# Altium footprint library Dahlia Carrier Board.PcbLib: 99 footprints (part 4 of 7)
Each footprint in its own frame and in the unit in brackets; x right, y up, seen from the top. Pads: shape width x height; smd on the part's side, far side on the other; paste and mask are expansions set on the pad; w line width, h text height; cw(c..) or ccw(c..) is an arc to the next point about the centre after c.
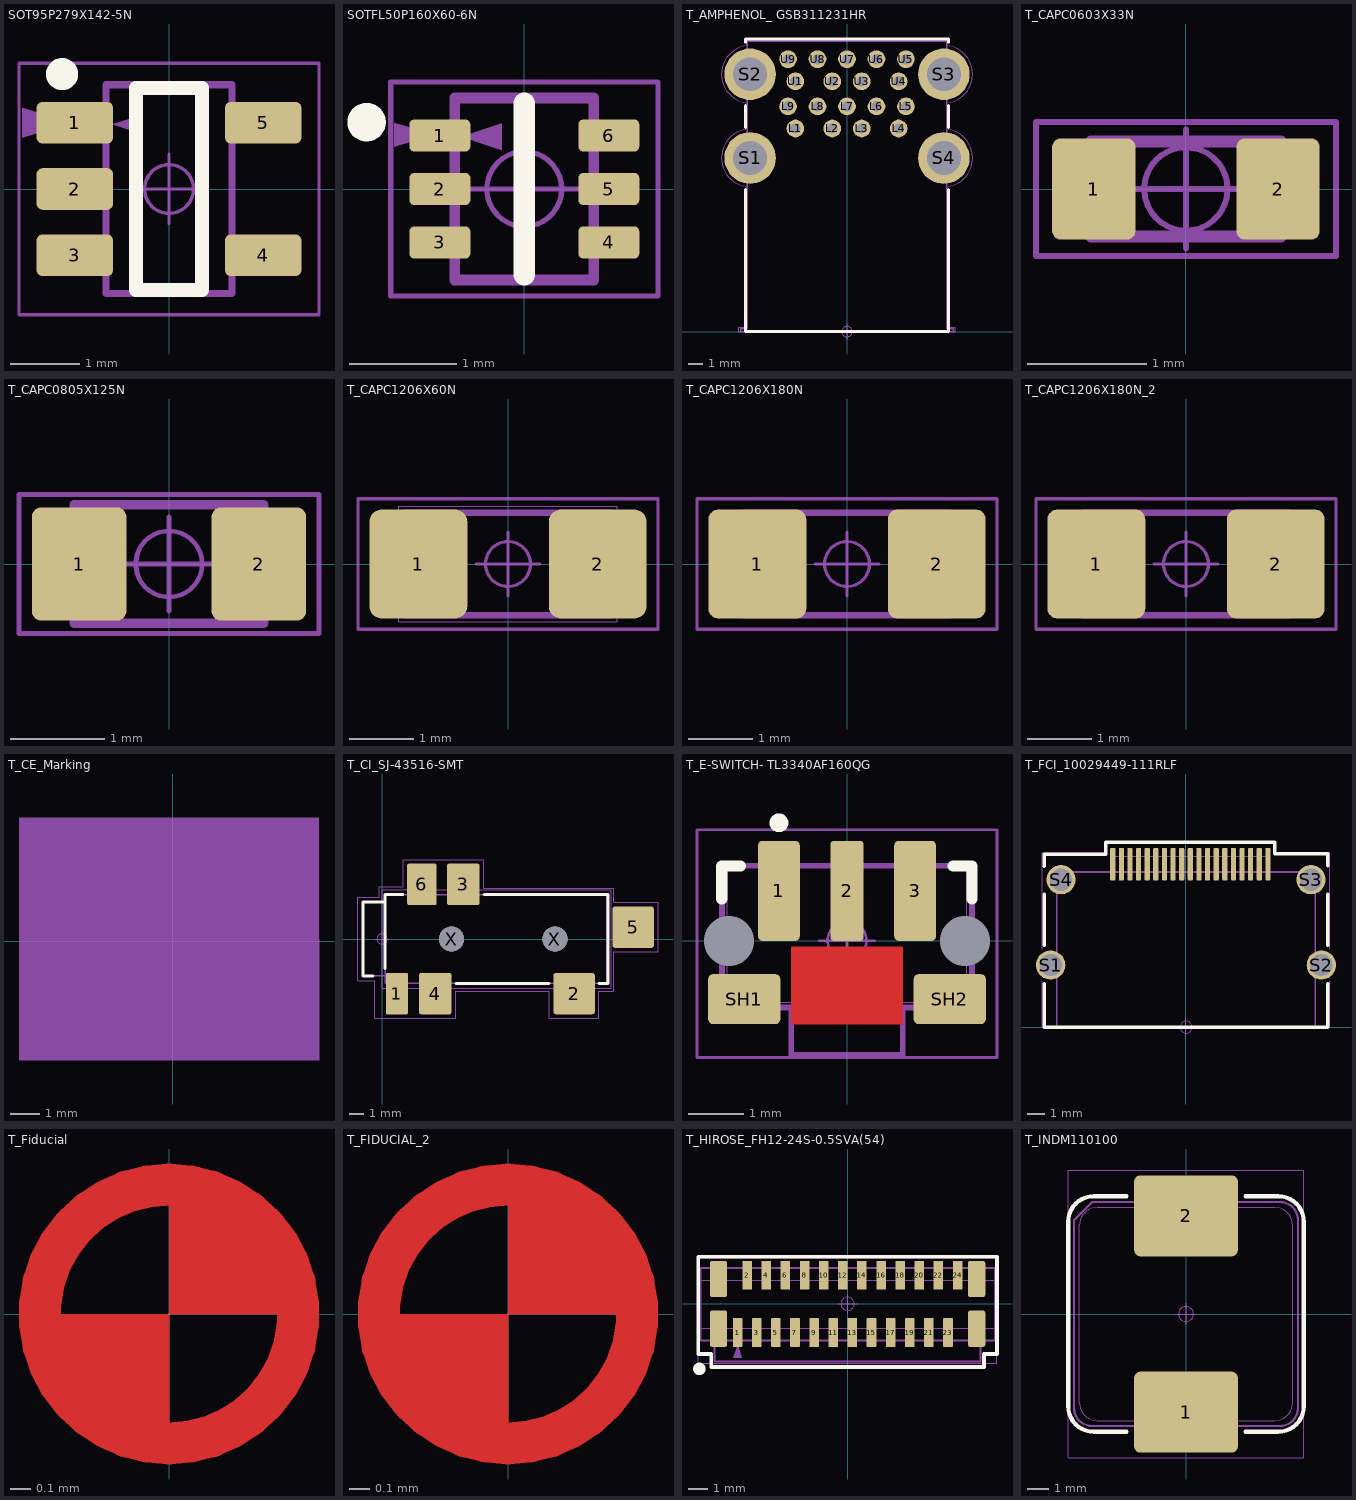
[diagram p3: the footprints below, top view; thin cyan lines are the x and y axes]

## SOT95P279X142-5N [mm]
height 13.83
pads (5):
  rrect30% 1.1x0.6 smd: 1(-1.35,0.95) 2(-1.35,0) 3(-1.35,-0.95) 4(1.35,-0.95) 5(1.35,0.95)
Top Overlay:
  circle w0.3: c-1.533,1.646 r0.08
  lines w0.2: -0.475,-1.45 -0.475,1.45 0.475,1.45 0.475,-1.45 -0.475,-1.45
Top Component Outline:
  region: -2.1,0.737 -1.39,0.95 -2.1,1.163
  lines w0.05: -2.15,-1.8 -2.15,1.8 2.15,1.8 2.15,-1.8 -2.15,-1.8
Top 3D Body:
  lines w0.001: -0.9,-1.45 -0.9,1.45 0.9,1.45 0.9,-1.45 -0.9,-1.45
Top Dimensions:
  region: -0.81,0.925 -0.429,1.052 -0.429,0.798
  lines w0.1: -0.9,-1.5 -0.9,1.5 0.9,1.5 0.9,-1.5 -0.9,-1.5
Top Component Center:
  circle w0.05: c0,0 r0.35
  lines w0.05: -0.5,0 0.5,0 ; 0,-0.5 0,0.5
Top Assembly:
  text ".Designator" at -1.7,2.25 h0.75
3D body "User Library-SOT23-5-2.step": height 1.45, standoff 0, extent -1.4,-1.45 1.4,1.45

## SOTFL50P160X60-6N [mm]
height 5.5
pads (6):
  rrect30% 0.57x0.3 smd: 1(-0.79,0.5) 2(-0.79,0) 3(-0.79,-0.5) 4(0.79,-0.5) 5(0.79,0) 6(0.79,0.5)
Top Overlay:
  circle w0.2: c-1.475,0.625 r0.08
  lines w0.2: 0,-0.8 0,0.8
Top Component Outline:
  region: -1.214,0.393 -0.836,0.507 -1.214,0.62
  lines w0.05: -1.25,-1 1.25,-1 1.25,1 -1.25,1 -1.25,-1
Top 3D Body:
  lines w0.001: -0.65,-0.85 0.65,-0.85 0.65,0.85 -0.65,0.85 -0.65,-0.85
Top Dimensions:
  region: -0.59,0.489 -0.209,0.616 -0.209,0.362
  lines w0.1: -0.65,-0.85 0.65,-0.85 0.65,0.85 -0.65,0.85 -0.65,-0.85
Top Component Center:
  circle w0.05: c0,0 r0.35
  lines w0.05: -0.5,0 0.5,0 ; 0,-0.5 0,0.5
Top Assembly:
  text ".Designator" at -1.4,1.35 h0.75
3D body "User Library-SOT-563.STEP": height 0.58, standoff 0, extent -0.813,-0.8 0.813,0.8

## T_AMPHENOL_ GSB311231HR [mm]
height 13.83
pads (22):
  round 1.2 hole 0.7: L1(-3.5,13.78) L2(-1,13.78) L3(1,13.78) L4(3.5,13.78) L5(4,15.28) L6(2,15.28) L7(0,15.28) L8(-2,15.28) L9(-4,15.28) U1(-3.5,16.98) U2(-1,16.98) U3(1,16.98) U4(3.5,16.98) U5(4,18.48) U6(2,18.48) U7(0,18.48) U8(-2,18.48) U9(-4,18.48)
  round 3.5 hole 2.3: S1(-6.57,11.78) S2(-6.57,17.46) S3(6.57,17.46) S4(6.57,11.78)
Top Overlay:
  lines w0.2: -6.9,9.65 -6.9,0 6.9,0 6.9,9.65 ; -6.9,13.85 -6.9,15.35 ; -6.9,19.63 -6.9,19.85 6.9,19.85 6.9,19.63 ; 6.9,13.85 6.9,15.35
Top Component Outline:
  lines w0.05: -6.809,9.837 -6.809,0.3 -7.349,0.3 -7.349,0 7.349,0 7.349,0.3 6.81,0.3 6.809,9.838 ; -6.809,13.725 -6.809,15.515 ; -6.809,9.837 cw(c-6.565,11.779) -6.809,13.722 ; -6.809,15.517 cw(c-6.565,17.459) -6.809,19.402 -6.809,19.76 6.809,19.76 6.809,19.403 ; 6.809,9.838 ccw(c6.565,11.781) 6.809,13.723 ; 6.809,15.518 ccw(c6.565,17.461) 6.809,19.403 ; 6.809,13.725 6.809,15.515
Top 3D Body:
  lines w0.01: -6.753,19.7 6.747,19.7 ; -6.75,19.7 -6.75,0.2 -7.2,0.2 -7.2,0 7.2,0 7.2,0.2 ; 6.75,19.7 6.75,0.2 7.2,0.2
Top Dimensions:
  lines w0.1: -7.2,0 -7.2,0.2 -6.75,0.2 -6.75,19.7 6.75,19.7 6.75,0.2 7.2,0.2 7.2,0 -7.2,0
Top Component Center:
  circle w0.05: c0,0 r0.35
  lines w0.05: -0.5,0 0.5,0 ; 0,-0.5 0,0.5
Top Assembly:
  text ".Designator" at 0.475,8.361 h0.75
3D body "GSB311231HR.STEP": height 16.13, standoff -3.49, extent -7.795,0 7.795,19.7

## T_CAPC0603X33N [mm]
pads (2):
  rrect20% 0.7x0.85 smd: 1(-0.775,0) 2(0.775,0)
Top Component Outline:
  lines w0.05: -1.261,-0.563 1.262,-0.563 1.262,0.563 -1.261,0.563 -1.261,-0.563
Top 3D Body:
  lines w0.001: -0.8,-0.4 0.8,-0.4 0.8,0.4 -0.8,0.4 -0.8,-0.4
Top Dimensions:
  lines w0.1: -0.8,-0.4 0.8,-0.4 0.8,0.4 -0.8,0.4 -0.8,-0.4
Top Component Center:
  circle w0.05: c0,0 r0.35
  lines w0.05: -0.5,0 0.5,0 ; 0,-0.5 0,0.5
Top Assembly:
  text ".Designator" at 0.575,0.25 h0.75
3D body "User Library-CAPC1608X09.step": height 0.9, standoff 0, extent -0.8,-0.4 0.8,0.4

## T_CAPC0805X125N [mm]
height 5.5
pads (2):
  rrect20% 1x1.2 smd: 1(-0.95,0) 2(0.95,0)
Top Component Outline:
  lines w0.05: -1.586,-0.736 -1.586,0.736 1.586,0.736 1.586,-0.736 -1.586,-0.736
Top 3D Body:
  lines w0.001: -1,-0.625 1,-0.625 1,0.625 -1,0.625 -1,-0.625
Top Dimensions:
  lines w0.1: -1,-0.625 -1,0.625 1,0.625 1,-0.625 -1,-0.625
Top Component Center:
  circle w0.05: c0,0 r0.35
  lines w0.05: -0.5,0 0.5,0 ; 0,-0.5 0,0.5
Top Assembly:
  text ".Designator" at -1.225,0.95 h0.75
3D body "User Library-CAPC2013X10.STEP": height 1, standoff 0, extent -1,-0.625 1,0.625

## T_CAPC1206X60N [mm]
pads (2):
  rrect25% 1.524x1.7 smd: 1(-1.397,0) 2(1.397,0)
Top Component Outline:
  lines w0.05: -2.337,-1.016 -2.337,1.016 2.336,1.016 2.336,-1.016 -2.337,-1.016
Top 3D Body:
  lines w0.001: -1.7,-0.9 1.7,-0.9 1.7,0.9 -1.7,0.9 -1.7,-0.9
Top Dimensions:
  lines w0.1: -1.6,-0.8 -1.6,0.8 1.6,0.8 1.6,-0.8 -1.6,-0.8
Top Component Center:
  circle w0.05: c0,0 r0.35
  lines w0.05: -0.5,0 0.5,0 ; 0,-0.5 0,0.5
Top Assembly:
  text ".Designator" at -0.6,-0.275 h0.75
3D body "c1206c225k5ractu.stp": height 1.8, standoff 0, extent -1.7,-0.9 1.7,0.9

## T_CAPC1206X180N [mm]
height 13.83
pads (2):
  rrect20% 1.524x1.7 smd: 1(-1.397,0) 2(1.397,0)
Top Component Outline:
  lines w0.05: -2.337,-1.016 -2.337,1.016 2.336,1.016 2.336,-1.016 -2.337,-1.016
Top 3D Body:
  lines w0.01: -1.6,-0.8 1.6,-0.8 1.6,0.8 -1.6,0.8 -1.6,-0.8
Top Dimensions:
  lines w0.1: -1.6,-0.8 -1.6,0.8 1.6,0.8 1.6,-0.8 -1.6,-0.8
Top Component Center:
  circle w0.05: c0,0 r0.35
  lines w0.05: -0.5,0 0.5,0 ; 0,-0.5 0,0.5
Top Assembly:
  text ".Designator" at -1.475,1.325 h0.75
3D body "capacitor 1206.step": height 1, standoff 0, extent -1.6,-0.8 1.6,0.8

## T_CAPC1206X180N_2 [mm]
pads (2):
  rrect20% 1.524x1.7 smd: 1(-1.397,0) 2(1.397,0)
Top Component Outline:
  lines w0.05: -2.337,-1.016 -2.337,1.016 2.336,1.016 2.336,-1.016 -2.337,-1.016
Top 3D Body:
  lines w0.01: -1.6,-0.8 1.6,-0.8 1.6,0.8 -1.6,0.8 -1.6,-0.8
Top Dimensions:
  lines w0.1: -1.6,-0.8 -1.6,0.8 1.6,0.8 1.6,-0.8 -1.6,-0.8
Top Component Center:
  circle w0.05: c0,0 r0.35
  lines w0.05: -0.5,0 0.5,0 ; 0,-0.5 0,0.5
Top Assembly:
  text ".Designator" at -1.475,1.325 h0.75
3D body "capacitor 1206.step": height 1, standoff 0, extent -1.6,-0.8 1.6,0.8

## T_CE_Marking [mm] "Silkscreen CE Marking"
height 5.49
Bottom Overlay:
  text "W" at 22.75,6.05 h10
  text "R" at 31.05,11.025 h15
  text "ELECTROSTATIC" at 33.9,4.7 h1.5
  text "ATTENTION" at 32.2,6 h1.5
  text "SENSITIVE DEVICE" at 34.5,3.4 h1.5
  text "C" at 23.85,16.425 h10
  text "e" at 32.8,5.425 h12
Top 3D Body:
  region: -5.283,4.242 5.029,4.242 5.029,-4.089 -5.283,-4.089

## T_CI_SJ-43516-SMT [mm] "STEREO_3.5mm AUDIO JACK  CUI"
height 5
pads (8):
  rrect12% 1.5x2.8 smd: 1(1,-3.7)
  rrect12% 2.8x2.8 smd: 2(13,-3.7) 5(17,0.8)
  rrect12% 2.2x2.8 smd: 3(5.5,3.7) 4(3.6,-3.7)
  rrect12% 2x2.8 smd: 6(2.7,3.7)
  round 1.7 hole 1.7 unplated: X(4.7,0) X(11.7,0)
Top Overlay:
  lines w0.2: -0.6,-2.5 -1.3,-2.5 -1.3,2.5 0.2,2.5 ; 0.2,-2 0.2,3 1.4,3 ; 5,-3 11.3,-3 ; 6.9,3 15.3,3 15.3,-3 14.7,-3
Top Component Outline:
  lines w0.05: -1.63,-2.83 -1.63,2.83 -0.19,2.83 -0.19,3.53 1.42,3.53 1.42,5.38 6.88,5.38 6.88,3.45 15.68,3.45 15.68,2.48 18.68,2.48 18.68,-0.87 15.68,-0.87 15.68,-3.53 14.68,-3.53 14.68,-5.38 11.32,-5.38 11.32,-3.53 4.98,-3.53 4.98,-5.38 -0.48,-5.38 -0.48,-2.83 -1.63,-2.83
Top 3D Body:
  lines w0.001: 0,-3.35 0,3.35 15.5,3.35 15.5,-3.35 0,-3.35
Top Dimensions:
  lines w0.1: 0.2,-2.5 -1.3,-2.5 -1.3,2.5 0.2,2.5 ; 0.2,-3 15.2,-3 15.2,3 0.2,3 0.2,-3
Top Component Center:
  circle w0.05: c0,0 r0.35
  lines w0.05: -0.5,0 0.5,0 ; 0,-0.5 0,0.5
Top Assembly:
  text ".Designator" at 7,-0.175 h0.75
3D body "SJ-43516-SMT.stp": height 5.12, standoff -0.68, extent -1.5,-4.5 17.7,4.5

## T_E-SWITCH- TL3340AF160QG [mm] "SWITCH TACT SUB MINI 160GF SMD"
height 3.3
pads (7):
  rrect20% 0.75x1.8 smd: 1(-1.225,0.9) 3(1.225,0.9)
  rrect20% 0.6x1.8 smd: 2(0,0.9)
  rrect20% 1.3x0.9 smd: SH1(-1.85,-1.05) SH2(1.85,-1.05)
  round 0.5 hole 0.9 unplated: ""(-2.125,0) ""(2.125,0)
Top Layer:
  pour cut-out: -1,-0.103 -1,-1.5 1,-1.5 1,-0.103
Top Overlay:
  circle w0.254: c-1.225,2.125 r0.041
  lines w0.2: -2.255,0.75 -2.255,1.35 -1.915,1.35 ; 1.91,1.35 2.25,1.35 2.25,0.75
Top Component Outline:
  lines w0.05: -2.7,-2.1 2.7,-2.1 2.7,2 -2.7,2 -2.7,-2.1
Top 3D Body:
  lines w0.001: -2.25,-1.105 2.25,-1.105 ; -2.155,-1.2 -2.155,1.35 ; -1,-1.2 -1,-2.05 1,-2.05 1,-1.2 ; 2,-1.2 2.25,-1.2 ; 2.155,-0.42 2.25,-0.42 ; 2.155,0.42 2.25,0.42 ; 2.155,1.35 2.155,-1.2 2.25,-1.2 ; -2.25,-1.2 -2,-1.2 -2.25,-1.2 ; -2.25,-1.2 2.25,-1.2 ; -2.25,-1.2 -2.25,1.35 2.25,1.35 2.25,-1.2
Top Dimensions:
  lines w0.1: -1,-1.2 -1,-2.05 1,-2.05 1,-1.2 ; -2.25,-1.2 2.25,-1.2 2.25,1.35 -2.25,1.35 -2.25,-1.2
Top Component Center:
  circle w0.05: c0,0 r0.35
  lines w0.05: -0.5,0 0.5,0 ; 0,-0.5 0,0.5
Top Assembly:
  text ".Designator" at 0.7,0.225 h0.75
3D body "TL3340AF160QG.stp": height 3.27, standoff -0.48, extent -2.25,-2.1 2.25,1.565

## T_FCI_10029449-111RLF [mm]
pads (23):
  rrect50% 0.3x1.9 smd: 1(4.75,9.45) 2(4.25,9.45) 3(3.75,9.45) 4(3.25,9.45) 5(2.75,9.45) 6(2.25,9.45) 7(1.75,9.45) 8(1.25,9.45) 9(0.75,9.45) 10(0.25,9.45) 11(-0.25,9.45) 12(-0.75,9.45) 13(-1.25,9.45) 14(-1.75,9.45) 15(-2.25,9.45) 16(-2.75,9.45) 17(-3.25,9.45) 18(-3.75,9.45) 19(-4.25,9.45)
  round 1.7 hole 1.3: S1(-7.85,3.6) S2(7.85,3.6) S3(7.25,8.55) S4(-7.25,8.55)
Top Overlay:
  lines w0.2: -8.225,2.525 -8.225,0 8.225,0 8.225,2.525 ; -8.225,4.745 -8.225,7.7 ; -8.225,9.315 -8.225,10.025 -4.65,10.025 -4.65,10.72 5.15,10.72 5.15,10.055 8.225,10.055 8.225,9.345 ; 8.225,4.745 8.225,7.7
Top Paste:
  circle w1: c-7.25,8.55 r0.351
  circle w1: c-7.85,3.6 r0.351
  circle w1: c7.85,3.6 r0.351
  circle w1: c7.25,8.55 r0.351
Top Component Outline:
  lines w0.05: -8.325,2.66 -8.325,0 8.325,0 8.325,2.66 ; -8.325,4.525 -8.325,10.125 -4.65,10.125 -4.65,10.695 5.15,10.695 5.15,10.15 8.325,10.15 8.325,4.525
Top 3D Body:
  lines w0.01: -7.5,0 -7.5,9 ; -7.5,0 7.5,0 ; -7.5,0 -7.5,9 ; -7.5,0 7.5,0 ; -7.5,9 7.5,9 ; -7.5,9 7.5,9 ; -4.35,9.9 4.85,9.9 ; -4.35,9.9 -4.35,9 -4.35,9.9 ; -4.35,9.9 4.85,9.9 ; 4.85,9.9 4.85,9 4.85,9.9 ; 7.5,0 7.5,9 ; 7.5,0 7.5,9
Top Dimensions:
  lines w0.1: -7.5,0 -7.5,9 7.5,9 7.5,0 -7.5,0
Top Component Center:
  circle w0.05: c0,0 r0.35
  lines w0.05: -0.5,0 0.5,0 ; 0,-0.5 0,0.5
Top Assembly:
  text ".Designator" at -1.875,11.15 h0.75
3D body "10029449-111RLF.STEP": height 6.17, standoff -1.83, extent -8.1,0 8.1,9.85

## T_Fiducial [mm]
height 5.49
pads (1):
  round 0.001 smd: ""(0,0)
Top Layer:
  region: 0,0 0,-0.6 -0.119,-0.6 -0.34,-0.509 -0.509,-0.34 -0.6,-0.119 -0.6,0
  region: 0,0 0,0.6 0.119,0.6 0.34,0.509 0.509,0.34 0.6,0.119 0.6,0
  lines w0.203: 0,-0.625 ccw(c0,0) 0,0.625 ccw(c0,0) 0,-0.625
Top Solder:
  circle w0.203: c0,0 r0.625
  region: -0.725,0 -0.725,0.071 -0.697,0.211 -0.642,0.343 -0.563,0.462 -0.462,0.563 -0.343,0.642 -0.211,0.697 -0.071,0.725 0,0.725 0.071,0.725 0.211,0.697 0.343,0.642 0.462,0.563 0.563,0.462 0.642,0.343 0.697,0.211 0.725,0.071 0.725,0 0.725,-0.071 0.697,-0.211 0.642,-0.343 0.563,-0.462 0.462,-0.563 0.343,-0.642 0.211,-0.697 0.071,-0.725 0,-0.725 -0.071,-0.725 -0.211,-0.697 -0.343,-0.642 -0.462,-0.563 -0.563,-0.462 -0.642,-0.343 -0.697,-0.211 -0.725,-0.071

## T_FIDUCIAL_2 [mm]
pads (1):
  round 0.001 smd: ""(0,0)
Top Layer:
  region: 0,0 0,0.6 0.119,0.6 0.34,0.509 0.509,0.34 0.6,0.119 0.6,0
  region: 0,0 0,-0.6 -0.119,-0.6 -0.34,-0.509 -0.509,-0.34 -0.6,-0.119 -0.6,0
  lines w0.203: 0,-0.625 cw(c0,0) 0,0.625 cw(c0,0) 0,-0.625
Top Solder:
  circle w0.203: c0,0 r0.625
  region: -0.725,0 -0.725,0.071 -0.697,0.211 -0.642,0.343 -0.563,0.462 -0.462,0.563 -0.343,0.642 -0.211,0.697 -0.071,0.725 0,0.725 0.071,0.725 0.211,0.697 0.343,0.642 0.462,0.563 0.563,0.462 0.642,0.343 0.697,0.211 0.725,0.071 0.725,0 0.725,-0.071 0.697,-0.211 0.642,-0.343 0.563,-0.462 0.462,-0.563 0.343,-0.642 0.211,-0.697 0.071,-0.725 0,-0.725 -0.071,-0.725 -0.211,-0.697 -0.343,-0.642 -0.462,-0.563 -0.563,-0.462 -0.642,-0.343 -0.697,-0.211 -0.725,-0.071

## T_HIROSE_FH12-24S-0.5SVA(54) [mm] "FFC Connector 0.5mm pitch Vertical"
height 5.5
pads (28):
  rrect12% 0.5x1.5 smd: 1(-5.75,-1.5) 2(-5.25,1.5) 3(-4.75,-1.5) 4(-4.25,1.5) 5(-3.75,-1.5) 6(-3.25,1.5) 7(-2.75,-1.5) 8(-2.25,1.5) 9(-1.75,-1.5) 10(-1.25,1.5) 11(-0.75,-1.5) 12(-0.25,1.5) 13(0.25,-1.5) 14(0.75,1.5) 15(1.25,-1.5) 16(1.75,1.5) 17(2.25,-1.5) 18(2.75,1.5) 19(3.25,-1.5) 20(3.75,1.5) 21(4.25,-1.5) 22(4.75,1.5) 23(5.25,-1.5) 24(5.75,1.5)
  rrect25% 0.9x1.9 smd: ""(-6.75,-1.3) ""(-6.75,1.3) ""(6.75,-1.3) ""(6.75,1.3)
Top Overlay:
  circle w0.4: c-7.75,-3.4 r0.125
  lines w0.2: -7.814,-2.625 -7.814,2.464 7.814,2.464 7.814,-2.625 7.132,-2.625 7.132,-3.307 -7.132,-3.307 -7.132,-2.625 -7.814,-2.625
Top Component Outline:
  region: -5.537,-2.825 -5.75,-2.115 -5.963,-2.825
  lines w0.05: -7.8,-3.116 7.8,-3.116 7.8,2.416 -7.8,2.416 -7.8,-3.116
Top 3D Body:
  lines w0.001: -6.95,-1.925 -6.95,-3.025 6.95,-3.025 6.95,-1.925
  lines w0.01: -7.7,-1.275 7.7,-1.275 ; -7.7,1.225 7.7,1.225 ; -7.7,-1.925 7.7,-1.925 7.7,1.875 -7.7,1.875 -7.7,-1.925
Top Dimensions:
  region: -5.746,-2.155 -5.523,-2.826 -5.97,-2.826
  lines w0.1: -6.95,-1.925 -6.95,-3.025 6.95,-3.025 6.95,-1.925 ; -7.7,-1.925 7.7,-1.925 7.7,1.875 -7.7,1.875 -7.7,-1.925
Top Component Center:
  circle w0.05: c0,0 r0.35
  lines w0.05: -0.5,0 0.5,0 ; 0,-0.5 0,0.5
Top Assembly:
  text ".Designator" at -0.625,-0.2 h0.75
3D body "FH12-24S-0.5SV.stp": height 5.52, standoff 0.02, extent -7.7,-1.925 7.7,1.875

## T_INDM110100 [mm]
height 13.83
pads (2):
  rrect15% 4.86x3.8 smd: 1(0,-4.6) 2(0,4.6)
Top Overlay:
  lines w0.2: -2.794,-5.523 -4.32,-5.523 cw(c-4.32,-4.32) -5.523,-4.32 -5.523,4.32 cw(c-4.32,4.32) -4.32,5.523 -2.794,5.523 ; 2.794,-5.523 4.32,-5.523 ccw(c4.32,-4.32) 5.523,-4.32 5.523,4.343 ; 2.794,5.523 4.32,5.523 cw(c4.32,4.32) 5.523,4.32
Top Component Outline:
  lines w0.05: -5.52,-6.731 5.52,-6.731 5.52,6.731 -5.52,6.731 -5.52,-6.731
Top 3D Body:
  lines w0.001: -5,-4.15 ccw(c-4.15,-4.15) -4.15,-5 4.15,-5 ccw(c4.15,-4.15) 5,-4.15 5,4.15 ccw(c4.15,4.15) 4.15,5 -4.15,5 ccw(c-4.15,4.15) -5,4.15 -5,-4.15 ; -1.6,3.2 -1.6,5.5 1.4,5.5 1.4,3.2 -1.6,3.2 ; -1.5,-5.5 1.5,-5.5 1.5,-3.2 -1.5,-3.2 -1.5,-5.5
Top Dimensions:
  lines w0.1: -5.25,-4.4 ccw(c-4.4,-4.4) -4.4,-5.25 4.4,-5.25 ccw(c4.4,-4.4) 5.25,-4.4 5.25,4.4 ccw(c4.4,4.4) 4.4,5.25 -4.4,5.25 -5.25,4.4 -5.25,-4.4
Top Component Center:
  circle w0.05: c0,0 r0.35
  lines w0.05: -0.5,0 0.5,0 ; 0,-0.5 0,0.5
Top Assembly:
  text ".Designator" at -2.075,7.175 h0.75
3D body "User Library-SRP 1038A.step": height 3.8, standoff -0.2, extent -5,-5.2 5,5.2